# Altium footprint library microbuilder.PCBLIB: 422 footprints (part 6 of 27)
Each footprint in its own frame and in the unit in brackets; x right, y up, seen from the top. Pads: shape width x height; smd on the part's side, far side on the other; paste and mask are expansions set on the pad; w line width, h text height; cw(c..) or ccw(c..) is an arc to the next point about the centre after c.
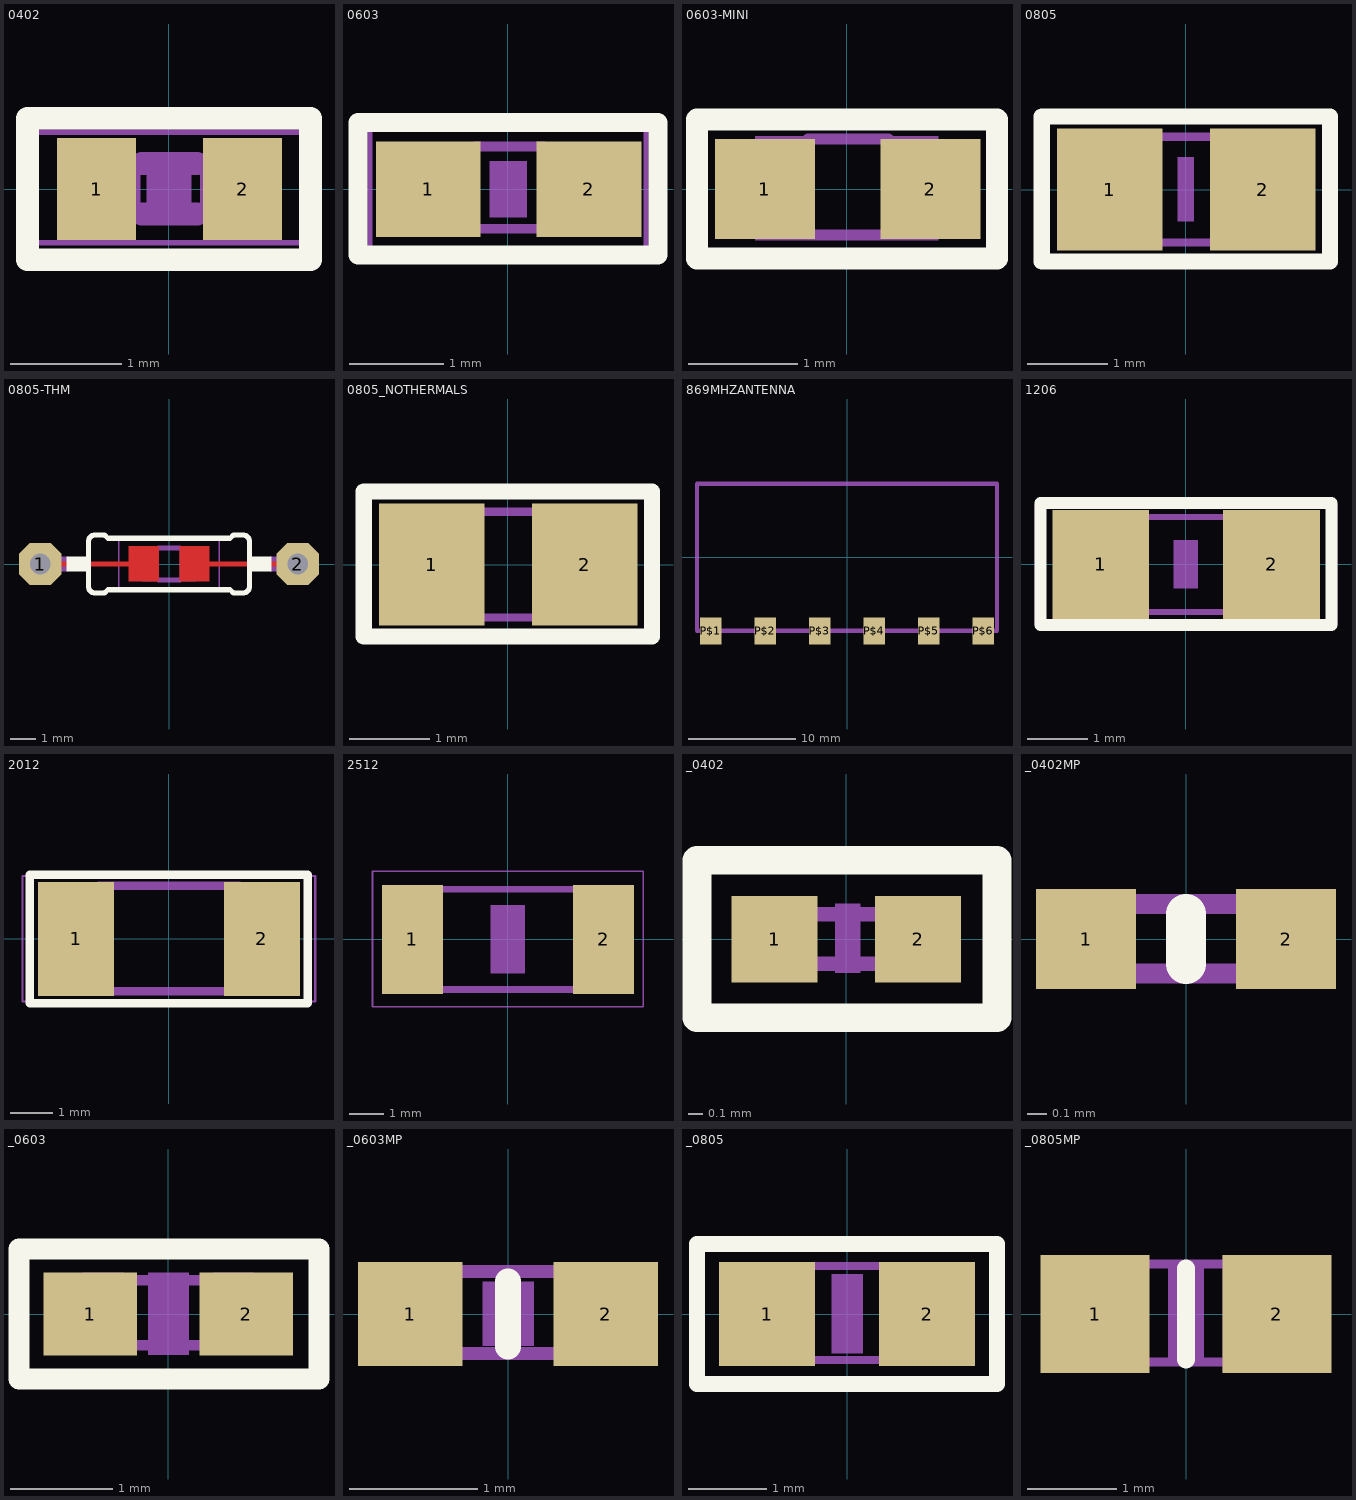
[diagram p5: the footprints below, top view; thin cyan lines are the x and y axes]

## 0402 [mil]
pads (2):
  rect 28x36 smd: 1(-25.59,0) 2(26,0)
Top Overlay:
  lines w8: -50,-25 -50,25 50,25 50,-25 -50,-25
Mechanical 6:
  rectangle: -7.87,-11.81 8,12
Mechanical 16:
  rectangle: -21.81,-12 -10,12
  rectangle: 11,-12 22,12
  lines w8: -9.65,-8.82 10,-8.82 ; -9.65,9 10,9
Mechanical 27:
  lines w2: -52.99,-19.02 53,-19.02 53,20 -52.99,20 -52.99,-19.02

## 0603 [mil]
pads (2):
  rect 44x40 smd: 1(-33.46,0) 2(34,0)
Top Overlay:
  lines w8: -62.99,-27.56 63,-27.56 63,28 -62.99,28 -62.99,-27.56
Mechanical 6:
  rectangle: -7.87,-11.81 8,12
Mechanical 16:
  rectangle: -33,-18.5 -13.31,19
  rectangle: 13,-18.5 33,19
  lines w4: -14.02,-16.5 15,-16.5 ; -14.02,18 15,18
Mechanical 27:
  lines w2: -57.99,-28.7 58,-28.7 58,29 -57.99,29 -57.99,-28.7

## 0603-MINI [mil]
pads (2):
  rect 36x36 smd: 1(-29.53,0) 2(30,0)
Top Overlay:
  lines w8: -53.94,-25 -53.94,25 54,25 54,-25 -53.94,-25
Mechanical 16:
  rectangle: -33,-18.5 -13.31,19
  rectangle: 13,-18.5 33,19
  lines w4: -14.02,-16.5 15,-16.5 ; -14.02,18 15,18
Mechanical 27:
  lines w2: -52.99,-22.95 53,-22.95 53,23 -52.99,23 -52.99,-22.95

## 0805 [mil]
pads (2):
  rect 52x60 smd: 1(-37.4,0) 2(38,0)
Top Overlay:
  lines w8: -70.87,-35.43 71,-35.43 71,36 -70.87,36 -70.87,-35.43
Mechanical 6:
  rectangle: -3.94,-15.75 4,16
Mechanical 16:
  rectangle: -43,-28.5 -13.47,29
  rectangle: 14,-28.5 44,29
  lines w4: -15,26 15,26 ; -14.02,-25.98 15,-25.98
Mechanical 27:
  lines w2: -73.74,-34.76 74,-34.76 74,35 -73.74,35 -73.74,-34.76

## 0805-THM [mil]
pads (2):
  oct 66x66 hole 32: 1(-200,0) 2(200,0)
Top Layer:
  rectangle: -62.99,-27.56 -15.75,28
  rectangle: 16,-27.56 63,28
  lines w8: -177.17,0 -43.31,0 ; 40,0 201,0
Top Overlay:
  rectangle: 125,-12 159,12
  rectangle: -159,-12 -125,12
  lines w8: -125,-35 ccw(c-115,-35) -115,-45 -100,-45 -95,-40 95,-40 100,-45 115,-45 ccw(c115,-35) 125,-35 125,35 ccw(c115,35) 115,45 100,45 95,40 -95,40 -100,45 -115,45 ccw(c-115,35) -125,35 -125,-35
Top Paste:
  rectangle: -62.99,-27.56 -15.75,28
  rectangle: 16,-27.56 63,28
Top Solder:
  rectangle: -66.93,-31.5 -11.81,32
  rectangle: 12,-31.5 67,32
Mechanical 16:
  rectangle: 16,-27.5 42,28
  rectangle: -42,-27.5 -16.41,28
  lines w8: -16.14,-25 17,-25 ; -16.14,25 17,25
  lines w24: -200,0 -160,0 ; 160,0 200,0
Mechanical 27:
  lines w2: -77.68,-38.7 78,-38.7 78,39 -77.68,39 -77.68,-38.7

## 0805_NOTHERMALS [mil]
pads (2):
  rect 52x60 smd: 1(-37.4,0) 2(38,0)
Top Overlay:
  lines w8: -70.87,-35.43 71,-35.43 71,36 -70.87,36 -70.87,-35.43
Mechanical 16:
  rectangle: -43,-28.5 -13.47,29
  rectangle: 14,-28.5 44,29
  lines w4: -15,26 15,26 ; -14.02,-25.98 15,-25.98
Mechanical 27:
  lines w2: -73.74,-34.76 74,-34.76 74,35 -73.74,35 -73.74,-34.76

## 869MHZANTENNA [mil]
pads (6):
  rect 79x99 smd: P$1(-500,-270) P$2(-300,-270) P$3(-100,-270) P$4(100,-270) P$5(300,-270) P$6(500,-270)
Mechanical 16:
  lines w16: -550,-270 -550,270 550,270 550,-270 -550,-270

## 1206 [mil]
pads (2):
  rect 63x71 smd: 1(-55.12,0) 2(56,0)
Top Overlay:
  lines w8: -94.49,-39.37 95,-39.37 95,40 -94.49,40 -94.49,-39.37
Mechanical 6:
  rectangle: -7.87,-15.75 8,16
Mechanical 16:
  rectangle: -67,-33.5 -37.47,34
  rectangle: 38,-33.43 67,34
  lines w4: -37.99,-30.98 38,-30.98 ; -37.99,31 38,31
Mechanical 27:
  lines w2: -97.36,-38.7 98,-38.7 98,39 -97.36,39 -97.36,-38.7

## 2012 [mil]
pads (2):
  rect 71x107 smd: 1(-86.61,0) 2(87,0)
Top Overlay:
  lines w8: -130,-60 130,-60 130,60 -130,60 -130,-60
Mechanical 16:
  rectangle: -98,-52 -64.54,53
  rectangle: 65,-52 99,53
  lines w8: -65.43,50 66,50 ; -64.45,-49.02 67,-49.02
Mechanical 27:
  lines w2: -136.73,-58.39 137,-58.39 137,59 -136.73,59 -136.73,-58.39

## 2512 [mil]
pads (2):
  rect 71x126 smd: 1(-110.24,0) 2(111,0)
Mechanical 6:
  rectangle: -19.69,-39.37 20,40
Mechanical 16:
  rectangle: -126,-61 -92.54,62
  rectangle: 93,-61 127,62
  lines w8: -92.99,-57.99 94,-57.99 ; -92.99,58 94,58
Mechanical 27:
  lines w2: -156.42,-78.07 157,-78.07 157,79 -156.42,79 -156.42,-78.07

## _0402 [mil]
pads (2):
  rect 24x24 smd: 1(-20,0) 2(20,0)
Top Overlay:
  lines w8: -41.63,-21.88 42,-21.87 42,22 -41.63,22 -41.63,-21.88
Mechanical 6:
  rectangle: -3.13,-9.37 4,10
Mechanical 16:
  rectangle: 10,-9.84 20,10
  rectangle: -19.68,-9.84 -9.84,10
  lines w4: -9.65,-6.85 10,-6.85 ; -9.65,7 10,7

## _0402MP [mil]
pads (2):
  rect 20x20 smd: 1(-20,0) 2(20,0)
Top Overlay:
  lines w8: 0,-5 0,5
Mechanical 6:
  rectangle: -3.94,-7.87 4,8
Mechanical 16:
  rectangle: -19.68,-9.84 -10,10
  rectangle: 11,-9.84 20,10
  lines w4: -9.65,-6.85 10,-6.85 ; -9.65,7 10,7

## _0603 [mil]
pads (2):
  rect 36x32 smd: 1(-30,0) 2(30,0)
Top Overlay:
  lines w8: -57.5,-25 58,-25 58,25 -57.5,25 -57.5,-25
Mechanical 6:
  rectangle: -7.87,-15.75 8,16
Mechanical 16:
  rectangle: 17,-15.75 33,16
  rectangle: -33,-15.75 -17,16
  lines w4: -17.01,-12.05 18,-12.05 ; -17.01,13 18,13

## _0603MP [mil]
pads (2):
  rect 32x32 smd: 1(-30,0) 2(30,0)
Top Overlay:
  lines w8: 0,-10 0,10
Mechanical 6:
  rectangle: -7.87,-9.84 8,10
Mechanical 16:
  rectangle: 17,-15.75 32,16
  rectangle: -31.5,-15.75 -17,16
  lines w4: -17.01,-12.05 18,-12.05 ; -17.01,13 18,13

## _0805 [mil]
pads (2):
  rect 48x52 smd: 1(-40,0) 2(40,0)
Top Overlay:
  lines w8: -75,-35 75,-35 75,35 -75,35 -75,-35
Mechanical 6:
  rectangle: -7.87,-19.69 8,20
Mechanical 16:
  rectangle: 16,-25.59 42,26
  rectangle: -42,-25.59 -16.41,26
  lines w4: -16.14,-23.03 17,-23.03 ; -16.14,24 17,24

## _0805MP [mil]
pads (2):
  rect 48x52 smd: 1(-40,0) 2(40,0)
Top Overlay:
  lines w8: 0,-20 0,20
Mechanical 6:
  rectangle: -7.87,-19.69 8,20
Mechanical 16:
  rectangle: 16,-25.59 40,26
  rectangle: -39.37,-25.59 -16.41,26
  lines w4: -20.08,-21.06 21,-21.06 ; -20.08,22 21,22